# Altium footprint library User.PcbLib: 317 footprints (part 4 of 20)
Each footprint in its own frame and in the unit in brackets; x right, y up, seen from the top. Pads: shape width x height; smd on the part's side, far side on the other; paste and mask are expansions set on the pad; w line width, h text height; cw(c..) or ccw(c..) is an arc to the next point about the centre after c.
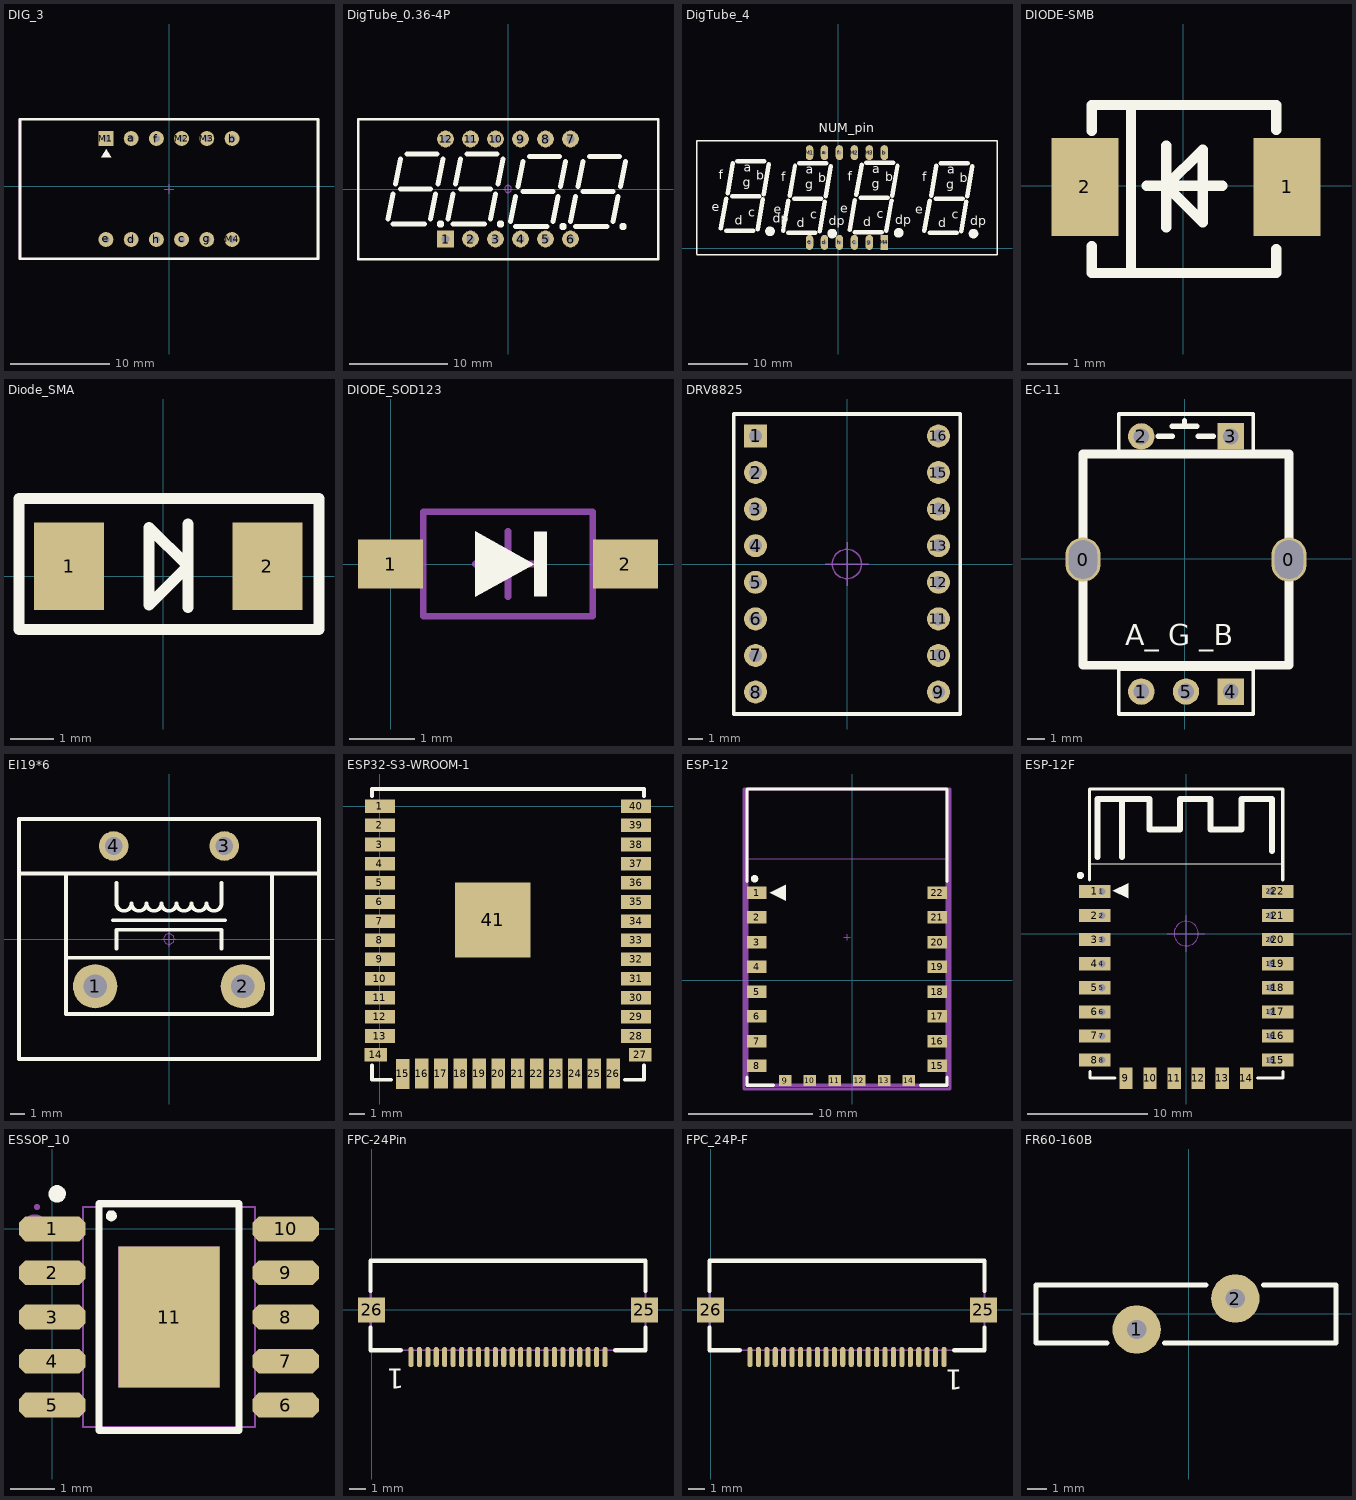
[diagram p3: the footprints below, top view; thin cyan lines are the x and y axes]

## DIG_3 [mm]
pads (12):
  round 1.5 hole 0.7: a(-3.81,4.78) b(6.35,4.78) c(1.27,-5.38) d(-3.81,-5.38) e(-6.35,-5.38) f(-1.27,4.78) g(3.81,-5.38) h(-1.27,-5.38) M2(1.27,4.78) M3(3.81,4.78) M4(6.35,-5.38)
  rect 1.5x1.5 hole 0.7: M1(-6.35,4.78)
Top Overlay:
  region: -6.3,3.7 -6.8,2.9 -5.8,2.9
  lines w0.254: -15,-7.3 15,-7.3 15,6.7 -15,6.7 -15,-7.3
Mechanical 15:
  lines w0.1: -0.5,-0.3 0.5,-0.3 ; 0,-0.8 0,0.2 ; -15.1,-7.3 -15.1,6.7 15.1,6.7 15.1,-7.3 -15.1,-7.3
3D body "DISP 0.36X4.step": height 7.2, standoff -5.4, extent -15,-7.3 15,6.7

## DigTube_0.36-4P [mm]
pads (12):
  rect 1.7x1.7 hole 0.8: 1(-6.35,-5.08)
  round 1.7 hole 0.8: 2(-3.81,-5.08) 3(-1.27,-5.08) 4(1.27,-5.08) 5(3.81,-5.08) 6(6.35,-5.08) 7(6.35,5.08) 8(3.81,5.08) 9(1.27,5.08) 10(-1.27,5.08) 11(-3.81,5.08) 12(-6.35,5.08)
Top Overlay:
  circle w0.381: c5.588,-3.81 r0.18
  circle w0.381: c11.684,-3.81 r0.18
  circle w0.381: c-6.858,-3.556 r0.18
  circle w0.381: c-0.762,-3.556 r0.18
  lines w0.254: -15.24,-7.112 -15.24,7.112 15.24,7.112 15.24,-7.112 -15.24,-7.112
  lines w0.508: -12.192,-3.048 -11.684,-0.508 ; -11.684,-3.556 -8.509,-3.556 ; -11.43,0.508 -10.922,3.048 ; -10.287,3.556 -7.239,3.556 ; -7.874,-3.048 -7.366,-0.508 ; -7.112,0.508 -6.604,3.048 ; -6.096,-3.048 -5.588,-0.508 ; -5.588,-3.556 -2.413,-3.556 ; -5.334,0.508 -4.826,3.048 ; -4.191,3.556 -1.143,3.556 ; -1.778,-3.048 -1.27,-0.508 ; -1.016,0.508 -0.508,3.048 ; 0.254,-3.302 0.762,-0.762 ; 0.762,-3.81 3.937,-3.81 ; 1.016,0.254 1.524,2.794 ; 2.159,3.302 5.207,3.302 ; 4.572,-3.302 5.08,-0.762 ; 5.334,0.254 5.842,2.794 ; 6.35,-3.302 6.858,-0.762 ; 6.858,-3.81 10.033,-3.81 ; 7.112,0.254 7.62,2.794 ; 8.255,3.302 11.303,3.302 ; 10.668,-3.302 11.176,-0.762 ; 11.43,0.254 11.938,2.794 ; -10.922,0 -7.874,0 -10.922,0 ; -4.826,0 -1.778,0 -4.826,0 ; 1.524,-0.254 4.572,-0.254 1.524,-0.254 ; 7.62,-0.254 10.668,-0.254 7.62,-0.254
Mechanical 15:
  circle w0.05: c0,0 r0.35
  lines w0.05: -0.5,0 0.5,0 ; 0,-0.5 0,0.5
3D body "SMG 0.36-4P.STEP": height 7.2, standoff -3.6, extent -15,-7 15,7

## DigTube_4 [mm]
pads (12):
  oval 1.27x2.54 hole 0.635: a(-2.319,16.241) b(7.841,16.241) c(2.761,1.001) d(-2.319,1.001) e(-4.859,1.001) f(0.221,16.241) g(5.301,1.001) h(0.221,1.001) M1(-4.859,16.241) M2(2.761,16.241) M3(5.301,16.241)
  rect 1.27x2.54 hole 0.635: M4(7.841,1.001)
Top Overlay:
  circle w1.016: c-1.024,2.499 r0.305
  circle w1.016: c-11.565,2.88 r0.305
  circle w1.016: c10.279,2.626 r0.305
  circle w1.016: c22.979,2.499 r0.305
  lines w0.254: -23.96,-1.082 26.967,-1.082 ; -23.96,-0.98 -23.96,18.222 26.967,18.222 26.967,-1.057
  lines w0.762: -19.896,3.363 -19.007,8.443 ; -19.007,2.982 -14.435,2.982 ; -18.753,9.332 -17.864,14.412 ; -17.991,8.824 -13.419,8.824 ; -17.102,14.793 -12.53,14.793 ; -13.673,3.236 -12.784,8.316 ; -12.657,9.205 -11.768,14.285 ; -9.355,2.982 -8.466,8.062 ; -8.466,2.601 -3.894,2.601 ; -8.212,8.951 -7.323,14.031 ; -7.45,8.443 -2.878,8.443 ; -6.561,14.412 -1.989,14.412 ; -3.132,2.855 -2.243,7.935 ; -2.116,8.824 -1.227,13.904 ; 1.948,3.109 2.837,8.189 ; 2.837,2.728 7.409,2.728 ; 3.091,9.078 3.98,14.158 ; 3.853,8.57 8.425,8.57 ; 4.742,14.539 9.314,14.539 ; 8.171,2.982 9.06,8.062 ; 9.187,8.951 10.076,14.031 ; 14.648,2.982 15.537,8.062 ; 15.537,2.601 20.109,2.601 ; 15.791,8.951 16.68,14.031 ; 16.553,8.443 21.125,8.443 ; 17.442,14.412 22.014,14.412 ; 20.871,2.855 21.76,7.935 ; 21.887,8.824 22.776,13.904
  text "c" at -4.732,5.014 h1.52
  text "dp" at -1.582,3.947 h1.52
  text "e" at -10.955,5.903 h1.52
  text "d" at -7.018,3.617 h1.52
  text "a" at -5.494,12.634 h1.52
  text "g" at -5.621,10.094 h1.52
  text "b" at -3.335,11.237 h1.52
  text "f" at -9.685,11.364 h1.52
  text "c" at -15.273,5.395 h1.52
  text "dp" at -11.107,4.328 h1.52
  text "e" at -21.496,6.284 h1.52
  text "d" at -17.559,3.998 h1.52
  text "a" at -16.035,13.015 h1.52
  text "g" at -16.162,10.475 h1.52
  text "b" at -13.876,11.618 h1.52
  text "f" at -20.226,11.745 h1.52
  text "c" at 6.571,5.141 h1.52
  text "dp" at 9.721,4.074 h1.52
  text "e" at 0.348,6.03 h1.52
  text "d" at 4.285,3.744 h1.52
  text "a" at 5.809,12.761 h1.52
  text "g" at 5.682,10.221 h1.52
  text "b" at 7.968,11.364 h1.52
  text "f" at 1.618,11.491 h1.52
  text "c" at 19.271,5.014 h1.52
  text "dp" at 22.421,3.947 h1.52
  text "e" at 13.048,5.903 h1.52
  text "d" at 16.985,3.617 h1.52
  text "a" at 18.509,12.634 h1.52
  text "g" at 18.382,10.094 h1.52
  text "b" at 20.668,11.237 h1.52
  text "f" at 14.318,11.364 h1.52
  text "NUM_pin" at -3.31,19.695 h1.52
3D body "4BIT_8SEG_LED.STEP": height 10, standoff 0, extent -24.509,-0.98 27.491,18.02

## DIODE-SMB [mm]
pads (2):
  rect 1.65x2.4 smd: 1(2.539,-0.025) 2(-2.411,-0.025)
Top Overlay:
  lines w0.254: -2.248,-1.473 -2.248,-2.134 2.273,-2.134 2.273,-1.549 ; -2.248,1.346 -2.248,1.981 2.273,1.981 2.273,1.372 ; -1.283,-2.057 -1.283,1.981 ; -0.902,0 0.953,0 ; -0.419,-1.016 -0.419,0.991 ; -0.419,0 0.47,-0.889 0.47,0.889 -0.419,0
3D body "DI-214AA(SMB).step": height 2.45, standoff 0.03, extent -2.687,-2.001 2.814,1.899

## Diode_SMA [mil] "SMA"
pads (2):
  rect 63x78.74 smd: 1(-85,9) 2(93.56,9)
Top Overlay:
  lines w10: 22,-28 22,47 ; -130,-48 140,-48 140,70 -130,70 -130,-48 ; -13,-26 22,9 -13,44 -13,-26
3D body "DO-214AC.STEP": height 94.49, standoff 0, extent -84.55,-43.15 96.55,63.15

## DIODE_SOD123 [mm]
pads (2):
  rect 1x0.75 smd: 1(0,0) 2(3.6,0)
Top Overlay:
  region: 2.2,0.5 2.2,-0.5 2.4,-0.5 2.4,0.5
  region: 1.3,-0.5 1.3,0.5 2.2,0
Mechanical 15:
  lines w0.1: 1.3,0 2.3,0 ; 1.8,-0.5 1.8,0.5 ; 0.5,-0.8 3.1,-0.8 3.1,0.8 0.5,0.8 0.5,-0.8
3D body "SOD123.STEP": height 1.27, standoff 0, extent -0.05,-0.8 3.65,0.8

## DRV8825 [mm] "长:20.5mm，宽:15.5mm，高:5mm"
pads (16):
  rect 1.6x1.6 hole 0.9: 1(-6.35,8.89)
  round 1.6 hole 0.9: 2(-6.35,6.35) 3(-6.35,3.81) 4(-6.35,1.27) 5(-6.35,-1.27) 6(-6.35,-3.81) 7(-6.35,-6.35) 8(-6.35,-8.89) 9(6.35,-8.89) 10(6.35,-6.35) 11(6.35,-3.81) 12(6.35,-1.27) 13(6.35,1.27) 14(6.35,3.81) 15(6.35,6.35) 16(6.35,8.89)
Top Overlay:
  lines w0.254: -7.874,-10.414 -7.874,10.414 7.874,10.414 7.874,-10.414 -7.874,-10.414
Mechanical 15:
  circle w0.1: c0,0 r1.016
  lines w0.1: -1.524,0 1.524,0 ; 0,-1.524 0,1.524
3D body "Header-F-2.54X8.stp": height 8.6, standoff -3.1, extent 5.069,-10.285 7.569,10.285
3D body "Header-F-2.54X8.stp": height 8.6, standoff -3.1, extent -7.631,-10.285 -5.131,10.285
3D body "DRV8825.STEP": height 14.71, standoff 3.18, extent -7.75,-10.25 7.75,10.25

## EC-11 [mm]
pads (7):
  oval 2x2.5 hole 2.2 slot 1.6 at 0 deg: 0(-5.782,-0.051) 0(5.918,-0.051)
  round 1.5 hole 0.9: 1(-2.472,-7.551) 2(-2.472,6.949) 5(0.068,-7.551)
  rect 1.5x1.5 hole 0.9: 3(2.608,6.949) 4(2.608,-7.551)
Top Overlay:
  lines w0.2: -3.742,5.949 -3.742,8.219 3.878,8.219 3.878,5.949 ; -3.742,-8.821 -3.742,-6.281 3.878,-6.281 3.878,-8.821 -3.742,-8.821
  lines w0.305: -1.499,6.949 -0.711,6.949 ; -0.711,7.518 0.675,7.518 ; -0.018,7.518 -0.018,7.841 ; 0.752,6.949 1.626,6.949
  lines w0.508: -5.782,-6.051 5.918,-6.051 5.918,5.949 -5.782,5.949 -5.782,-6.051
  text "A_ G _B" at -3.378,-5.315 h2.03
3D body "EC12E-bushing-20.STEP": height 20.05, standoff -3.5, extent -6.919,-7.747 7.072,6.503

## EI19*6 [mm] "20*16*17.5mm"
pads (4):
  round 3 hole 1.6: 1(-5,-3.2) 2(5,-3.2)
  round 2 hole 1.2: 3(3.75,6.3) 4(-3.75,6.3)
Top Overlay:
  lines w0.254: -10.16,4.445 -6.985,4.445 ; -6.985,-1.27 6.985,-1.27 ; -3.81,1.27 3.81,1.27 ; -3.556,-0.635 -3.556,-0.381 -3.556,0.635 3.556,0.635 3.556,-0.635 ; -3.556,3.81 -3.556,2.286 -3.556,2.413 ccw(c-3.048,2.413) -2.54,2.413 ccw(c-2.032,2.413) -1.524,2.413 ccw(c-1.016,2.413) -0.508,2.413 ccw(c0,2.413) 0.508,2.413 ccw(c1.016,2.413) 1.524,2.413 ccw(c2.032,2.413) 2.54,2.413 ccw(c3.048,2.413) 3.556,2.413 3.556,3.81 ; 10.16,4.445 6.985,4.445 ; -6.985,4.445 6.985,4.445 ; -6.985,4.445 -6.985,-5.08 6.985,-5.08 6.985,4.445 ; -10.16,-8.128 10.16,-8.128 10.16,8.128 -10.16,8.128 -10.16,-8.128
Mechanical 15:
  circle w0.05: c0,0 r0.35
  lines w0.05: -0.5,0 0.5,0 ; 0,-0.5 0,0.5
3D body "EI19x6.STEP": height 15.5, standoff -3.2, extent -10,-8 10,8

## ESP32-S3-WROOM-1 [mm]
pads (41):
  rect 2x0.9 smd: 1(0,0) 2(0,-1.27) 3(0,-2.54) 4(0,-3.81) 5(0,-5.08) 6(0,-6.35) 7(0,-7.62) 8(0,-8.89) 9(0,-10.16) 10(0,-11.43) 11(0,-12.7) 12(0,-13.97) 13(0,-15.24) 28(17,-15.24) 29(17,-13.97) 30(17,-12.7) 31(17,-11.43) 32(17,-10.16) 33(17,-8.89) 34(17,-7.62) 35(17,-6.35) 36(17,-5.08) 37(17,-3.81) 38(17,-2.54) 39(17,-1.27) 40(17,0)
  rect 1.5x0.9 smd: 14(-0.263,-16.485) 27(17.263,-16.485)
  rect 0.9x2 smd: 15(1.515,-17.755) 16(2.785,-17.73) 17(4.055,-17.73) 18(5.325,-17.73) 19(6.595,-17.73) 20(7.865,-17.73) 21(9.135,-17.73) 22(10.405,-17.73) 23(11.675,-17.73) 24(12.945,-17.73) 25(14.215,-17.73) 26(15.485,-17.73)
  rect 5x5 smd: 41(7.483,-7.543)
Top Overlay:
  lines w0.254: -0.517,-17.191 -0.517,-18.136 0.753,-18.136 ; -0.517,0.681 -0.517,1.143 17.517,1.143 17.517,0.681 ; 16.247,-18.136 17.517,-18.136 17.517,-17.191
3D body "ESP32-S3-WROOM.step": height 3.11, standoff -0.05, extent -0.517,-18.136 17.503,7.374

## ESP-12 [mm]
pads (22):
  rect 1.6x1 smd: 1(-7.732,7.072) 2(-7.732,5.072) 3(-7.732,3.072) 4(-7.732,1.072) 5(-7.732,-0.928) 6(-7.732,-2.928) 7(-7.732,-4.928) 8(-7.732,-6.928) 15(6.868,-6.928) 16(6.868,-4.928) 17(6.868,-2.928) 18(6.868,-0.928) 19(6.868,1.072) 20(6.868,3.072) 21(6.868,5.072) 22(6.868,7.072)
  rect 1x0.9 smd: 9(-5.432,-8.128) 10(-3.432,-8.128) 11(-1.432,-8.128) 12(0.568,-8.128) 13(2.568,-8.128) 14(4.568,-8.128)
Top Overlay:
  circle w0.3: c-7.907,8.197 r0.15
  region: -6.662,7.072 -5.392,6.437 -5.392,7.707
  lines w0.254: -8.515,-7.844 -8.515,-8.496 -6.363,-8.496 ; -8.515,7.988 -8.515,15.443 7.652,15.443 7.652,7.988 ; 5.5,-8.496 7.652,-8.496 7.652,-7.844
Mechanical 13:
  lines w0.051: -8.559,9.799 -8.559,15.454 7.697,15.454 7.697,9.799 -8.559,9.799
  lines w0.254: -8.515,-8.496 7.652,-8.496 7.652,15.443 -8.515,15.443 -8.515,-8.496
Mechanical 15:
  lines w0.1: -0.686,3.474 -0.178,3.474 ; -0.432,3.22 -0.432,3.728
  lines w0.254: -8.757,-8.803 -8.757,15.443 7.893,15.443 7.893,-8.803 -8.757,-8.803
3D body "ESP_12_E.STEP": height 2.75, standoff 0.04, extent -8.431,-8.419 7.569,15.581

## ESP-12F [mm] "ESP-12E&F"
height 3.2
pads (38):
  rect 2.6x1.1 smd: 1(-7.6,3.5) 2(-7.6,1.5) 3(-7.6,-0.5) 4(-7.6,-2.5) 5(-7.6,-4.5) 6(-7.6,-6.5) 7(-7.6,-8.5) 8(-7.6,-10.5) 15(7.6,-10.5) 16(7.6,-8.5) 17(7.6,-6.5) 18(7.6,-4.5) 19(7.6,-2.5) 20(7.6,-0.5) 21(7.6,1.5) 22(7.6,3.5)
  rect 0.762x1 hole 0.6: 1(-7,3.5) 7(-7,-8.5)
  rect 0.762x1 / inner rect 0.762x1 / far side rect 1x1 hole 0.6: 2(-7,1.5) 3(-7,-0.5) 4(-7,-2.5) 5(-7,-4.5) 6(-7,-6.5) 8(-7,-10.5) 15(7,-10.5) 16(7,-8.5) 17(7,-6.5) 18(7,-4.5) 19(7,-2.5) 20(7,-0.5) 21(7,1.5) 22(7,3.5)
  rect 1.1x1.8 smd: 9(-5,-12) 10(-3,-12) 11(-1,-12) 12(1,-12) 13(3,-12) 14(5,-12)
Top Overlay:
  circle w0.3: c-8.786,4.826 r0.15
  region: -6.096,3.556 -4.826,2.921 -4.826,4.191
  lines w0.1: -8,5.8 8,5.8
  lines w0.254: -8.01,4.454 -8.01,12 ; -8.001,-11.43 -8,-11.431 -8,-12 -5.907,-12 ; -8,12 8,12 ; 5.907,-12 8,-12 ; 8.01,4.454 8.01,12 ; 8.02,-12 8.02,-11.431
  lines w0.5: -7.366,6.35 -7.366,11.176 -3.048,11.176 -3.048,8.636 -0.508,8.636 -0.508,11.176 2.032,11.176 2.032,8.636 4.572,8.636 4.572,11.176 7.112,11.176 7.112,6.858 ; -5.334,6.35 -5.334,11.176
Mechanical 15:
  circle w0.1: c0,0 r1.016
  lines w0.1: -1.524,0 1.524,0 ; 0,-1.524 0,1.524
3D body "ESP-12E&F.STEP": height 3.35, standoff 0.02, extent -8.01,-12.01 8.01,12

## ESSOP_10 [mil]
pads (11):
  oct 59.6x22 smd mask+2: 1(0,0) 2(0,-39.3) 3(0,-78.7) 4(0,-118.1) 5(0,-157.4) 6(208.6,-157.4) 7(208.6,-118.1) 8(208.6,-78.7) 9(208.6,-39.3) 10(208.6,0)
  rect 90.6x126 smd mask+2: 11(104.3,-78.7)
Top Overlay:
  lines w4.9: 50.21,11.57 50.3,12.48 ; 50.46,10.69 51.02,9.95 ; 50.7,13.31 51.38,13.93 ; 51.8,9.47 52.7,9.3 53.6,9.47 ; 52.24,14.26 53.16,14.26 ; 54.02,13.93 54.7,13.31 ; 54.38,9.95 54.94,10.69 ; 55.1,12.48 55.19,11.57
  lines w6: 41.8,-180.1 166.8,-180.1 166.8,22.7 41.8,22.7 41.8,-180.1
  lines w7.9: 0.41,31.06 0.47,32.03 ; 0.59,30.09 1.01,29.21 ; 0.77,32.96 1.29,33.79 ; 1.63,28.46 2.42,27.88 ; 2.01,34.46 2.86,34.93 ; 3.33,27.52 4.3,27.4 5.27,27.52 ; 3.81,35.17 4.79,35.17 ; 5.74,34.93 6.59,34.46 ; 6.18,27.88 6.97,28.46 ; 7.3,33.79 7.83,32.96 ; 7.59,29.21 8.01,30.09 ; 8.13,32.03 8.19,31.06
Mechanical 6:
  lines w11.8: -21.6,1.54 -21.48,2.48 ; -21.56,0.59 -21.37,-0.34 ; -21.22,3.39 -20.81,4.25 ; -21.03,-1.23 -20.56,-2.05 ; -20.27,5.03 -19.61,5.72 ; -19.96,-2.79 -19.24,-3.42 ; -18.85,6.29 -18.01,6.73 ; -18.44,-3.92 -17.57,-4.3 ; -17.11,7.03 -16.17,7.18 ; -16.65,-4.52 -15.7,-4.6 -14.75,-4.52 ; -15.23,7.18 -14.29,7.03 ; -13.83,-4.3 -12.96,-3.92 ; -13.39,6.73 -12.55,6.29 ; -12.16,-3.42 -11.44,-2.79 ; -11.79,5.72 -11.13,5.03 ; -10.84,-2.05 -10.37,-1.23 ; -10.59,4.25 -10.18,3.39 ; -10.03,-0.34 -9.84,0.59 ; -9.92,2.48 -9.8,1.54
Mechanical 15:
  drawing of 26 lines, arcs and shapes, not listed
3D body "esson.STEP": height 74.8, standoff 3.94, extent -13.8,-177.13 222.4,19.7

## FPC-24Pin [mm]
pads (26):
  oval 0.3x1.2 smd: 1(2.335,-2.789) 2(2.835,-2.789) 3(3.335,-2.789) 4(3.835,-2.789) 5(4.335,-2.789) 6(4.835,-2.789) 7(5.335,-2.789) 8(5.835,-2.789) 9(6.335,-2.789) 10(6.835,-2.789) 11(7.335,-2.789) 12(7.835,-2.789) 13(8.335,-2.789) 14(8.835,-2.789) 15(9.335,-2.789) 16(9.835,-2.789) 17(10.335,-2.789) 18(10.835,-2.789) 19(11.335,-2.789) 20(11.835,-2.789) 21(12.335,-2.789) 22(12.835,-2.789) 23(13.335,-2.789) 24(13.835,-2.789)
  rect 1.6x1.5 smd: 25(16.17,0) 26(0,0)
Top Overlay:
  lines w0.25: -0.065,-1.042 -0.065,-2.39 1.735,-2.39 ; -0.065,1.117 -0.065,2.91 16.235,2.91 16.235,1.117 ; 14.435,-2.39 16.235,-2.39 16.235,-1.042
  text "1" at 1.93,-3.073 h2.03
Mechanical 15:
  lines w0.1: -0.065,-2.39 -0.065,2.91 16.235,2.91 16.235,-2.39 -0.065,-2.39
3D body "HEADER-FPC-ZIF-SMD-Horizontal-0.5-24.stp": height 2.2, standoff -0.05, extent 0.035,-2.996 16.135,3.503

## FPC_24P-F [mm] "0.5MM"
pads (26):
  oval 0.3x1.2 smd: 1(13.835,-2.789) 2(13.335,-2.789) 3(12.835,-2.789) 4(12.335,-2.789) 5(11.835,-2.789) 6(11.335,-2.789) 7(10.835,-2.789) 8(10.335,-2.789) 9(9.835,-2.789) 10(9.335,-2.789) 11(8.835,-2.789) 12(8.335,-2.789) 13(7.835,-2.789) 14(7.335,-2.789) 15(6.835,-2.789) 16(6.335,-2.789) 17(5.835,-2.789) 18(5.335,-2.789) 19(4.835,-2.789) 20(4.335,-2.789) 21(3.835,-2.789) 22(3.335,-2.789) 23(2.835,-2.789) 24(2.335,-2.789)
  rect 1.6x1.5 smd: 25(16.17,0) 26(0,0)
Top Overlay:
  lines w0.25: -0.065,-1.042 -0.065,-2.39 1.735,-2.39 ; -0.065,1.117 -0.065,2.91 16.235,2.91 16.235,1.117 ; 14.435,-2.39 16.235,-2.39 16.235,-1.042
  text "1" at 14.935,-3.124 h2.03
Mechanical 15:
  lines w0.1: -0.065,-2.39 -0.065,2.91 16.235,2.91 16.235,-2.39 -0.065,-2.39
3D body "HEADER-FPC-ZIF-SMD-Horizontal-0.5-24.stp": height 2.2, standoff -0.05, extent 0.035,-3.25 16.135,3.249

## FR60-160B [mm] "直径15.5mm，厚度3mm，脚距5.1mm"
pads (2):
  round 2.5 hole 1: 1(-2.7,-0.8) 2(2.4,0.8)
Top Overlay:
  lines w0.254: -4.216,-1.5 -7.899,-1.5 -7.899,1.5 0.889,1.499 ; -1.27,-1.499 7.601,-1.5 7.601,1.5 3.861,1.499
3D body "RF60-160B.STEP": height 18.5, standoff -3.5, extent -7.899,-1.5 7.601,1.5